# Altium footprint library lib_protel_HC.PCBLIB: 724 footprints (part 41 of 46)
Each footprint in its own frame and in the unit in brackets; x right, y up, seen from the top. Pads: shape width x height; smd on the part's side, far side on the other; paste and mask are expansions set on the pad; w line width, h text height; cw(c..) or ccw(c..) is an arc to the next point about the centre after c.
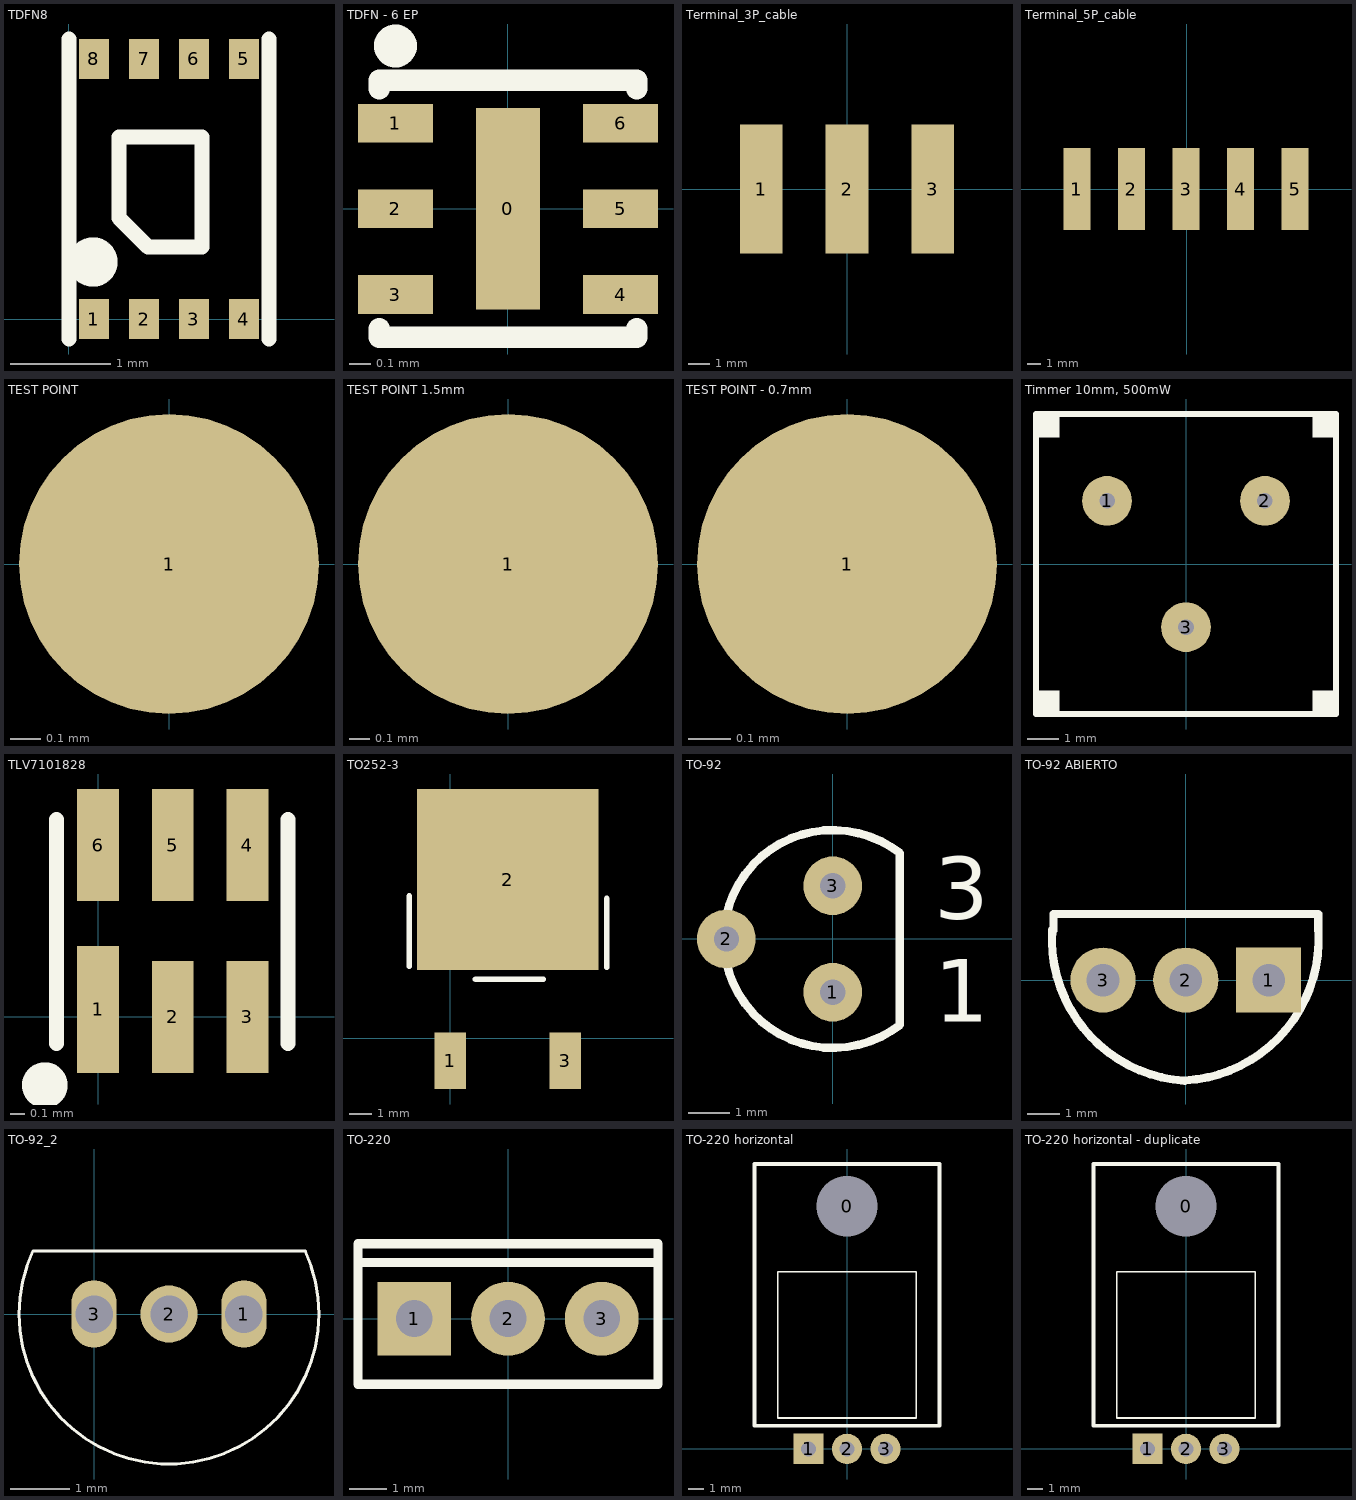
[diagram p40: the footprints below, top view; thin cyan lines are the x and y axes]

## TDFN8 [mm] "CASE 511AK-01 MEMORIA EEPROM"
height 0.75
pads (8):
  rect 0.3x0.4 smd mask+0.05: 1(0.25,0) 2(0.75,0) 3(1.25,0) 4(1.75,0) 5(1.75,2.6) 6(1.25,2.6) 7(0.75,2.6) 8(0.25,2.6)
Top Overlay:
  circle w0.254: c0.24,0.57 r0.12
  lines w0.15: 0,-0.2 0,2.8 ; 1.32,1.82 0.5,1.82 0.5,1.01 0.79,0.72 1.33,0.72 1.33,1.82 ; 2,-0.2 2,2.8

## TDFN - 6 EP [mm] "6-TDFN (1.2x1.2)"
height 0.6
pads (7):
  rect 0.3x0.94 smd mask+0: 0(0,0)
  rect 0.35x0.18 smd mask+0.05: 1(-0.525,0.4) 2(-0.525,0) 3(-0.525,-0.4) 4(0.525,-0.4) 5(0.525,0) 6(0.525,0.4)
Top Overlay:
  circle w0.15: c-0.525,0.76 r0.025
  lines w0.1: -0.6,-0.56 -0.6,-0.6 0.6,-0.6 0.6,-0.56 ; -0.6,0.56 -0.6,0.6 0.6,0.6 0.6,0.56

## Terminal_3P_cable [mm] "Terminal de 3 pines al aire para soldar cable"
pads (3):
  rect 2x6 smd: 1(-4,0) 2(0,0) 3(4,0)

## Terminal_5P_cable [mm] "Terminal de 5 pines al aire para soldar cable"
pads (5):
  rect 2x6 smd: 1(-8.05,0.025) 2(-4.05,0.025) 3(-0.05,0.025) 4(3.95,0.025) 5(7.95,0.025)

## TEST POINT [mm] "TEST POINT"
pads (1):
  round 1 smd mask+0: 1(0,0)

## TEST POINT 1.5mm [mm] "TEST POINT"
pads (1):
  round 1.5 smd mask+0: 1(0,0)

## TEST POINT - 0.7mm [mm] "TEST POINT"
pads (1):
  round 0.7 smd mask+0: 1(0,0)

## Timmer 10mm, 500mW [mm]
pads (3):
  round 1.6 on Top hole 0.5: 1(-2.54,2.032) 2(2.54,2.032) 3(0,-2.032)
Top Overlay:
  rectangle: -4.826,4.064 -4.064,4.826
  rectangle: 4.064,4.064 4.826,4.826
  rectangle: 4.064,-4.826 4.826,-4.064
  rectangle: -4.826,-4.826 -4.064,-4.064
  lines w0.2: -4.826,-4.826 4.826,-4.826 4.826,4.826 -4.826,4.826 -4.826,-4.826

## TLV7101828 [mm] "Regulador doble salida"
height 0.75
pads (6):
  rect 0.28x0.85 smd mask+0.05: 1(0,0.05)
  rect 0.28x0.75 smd mask+0.05: 2(0.5,0) 3(1,0) 4(1,1.15) 5(0.5,1.15) 6(0,1.15)
Top Overlay:
  circle w0.254: c-0.356,-0.457 r0.025
  lines w0.1: -0.279,-0.178 -0.279,1.321 ; 1.27,-0.178 1.27,1.321

## TO252-3 [mm] "POWER REGULATOR"
height 2.3
pads (3):
  rect 1.4x2.5 smd: 1(0,-1) 3(5.08,-1)
  rect 8x8 smd: 2(2.54,7)
Top Overlay:
  lines w0.25: -1.803,3.175 -1.803,6.275 ; 1.118,2.591 4.108,2.591 ; 6.909,3.124 6.909,6.164

## TO-92 [mm]
pads (3):
  round 1.4 on Top hole 0.6: 1(0,-1.27) 2(-2.54,0) 3(0,1.27)
Top Overlay:
  lines w0.2: 1.601,-2.049 cw(c0,0) 1.601,2.049 ; 1.6,-1.99 1.6,1.99
  text "3" at 2.421,0.467 h1.5
  text "1" at 2.421,-1.979 h1.5

## TO-92 ABIERTO [mm]
pads (3):
  rect 2x2 hole 1: 1(2.54,0)
  round 2 / inner round 0 / far side round 0 hole 1: 2(0,0)
  round 2 hole 1: 3(-2.54,0)
Top Overlay:
  lines w0.25: -4.064,1.524 -4.064,2.032 4.064,2.032 4.064,1.524
  lines w0.254: -4.1,1.54 ccw(c0.25,1.26) -0.03,-3.09 ; -0.03,-3.08 ccw(c-0.26,1.25) 4.07,1.48

## TO-92_2 [mil] "TRANSISTOR"
height 300
pads (3):
  oval 30x45 hole 25 mask+3.94: 1(100,0)
  round 38 hole 25 mask+3.94: 2(50,0)
  oval 30x45 hole 25 mask+4: 3(0,0)
Top Overlay:
  lines w2: -40.8,41.91 ccw(c50,0) 140.8,41.91 ; -40,42 141,42

## TO-220 [mm]
pads (3):
  rect 2x2 on Top hole 1: 1(-2.54,0)
  round 2 on Top hole 1: 2(0,0) 3(2.54,0)
Top Overlay:
  lines w0.25: -4.064,1.524 -4.064,2.032 4.064,2.032 4.064,1.524 ; -4.064,1.524 4.064,1.524 ; -4.064,1.524 -4.064,-1.778 4.064,-1.778 4.064,1.524

## TO-220 horizontal [mm] "para colocación horizontal"
pads (4):
  oval 2.8x2 on Top hole 4: 0(0,16)
  rect 2x2 on Top hole 1: 1(-2.54,0)
  round 2 on Top hole 1: 2(0,0) 3(2.54,0)
Top Overlay:
  lines w0.127: -4.572,2.032 -4.572,11.684 4.572,11.684 4.572,2.032 -4.572,2.032
  lines w0.254: -6.096,1.524 6.096,1.524 6.096,18.796 -5.588,18.796 -6.096,18.796 -6.096,1.524

## TO-220 horizontal - duplicate [mm]
pads (4):
  oval 2.8x2 on Top hole 4: 0(0,16)
  rect 2x2 on Top hole 1: 1(-2.54,0)
  round 2 on Top hole 1: 2(0,0) 3(2.54,0)
Top Overlay:
  lines w0.127: -4.572,2.032 4.572,2.032 4.572,11.684 -4.572,11.684 -4.572,2.032
  lines w0.254: -6.096,1.524 -6.096,18.796 -5.588,18.796 6.096,18.796 6.096,1.524 -6.096,1.524